# Altium footprint library UP-ROBOT Other(2012-07-12).PcbLib: 29 footprints (part 2 of 2)
Each footprint in its own frame and in the unit in brackets; x right, y up, seen from the top. Pads: shape width x height; smd on the part's side, far side on the other; paste and mask are expansions set on the pad; w line width, h text height; cw(c..) or ccw(c..) is an arc to the next point about the centre after c.
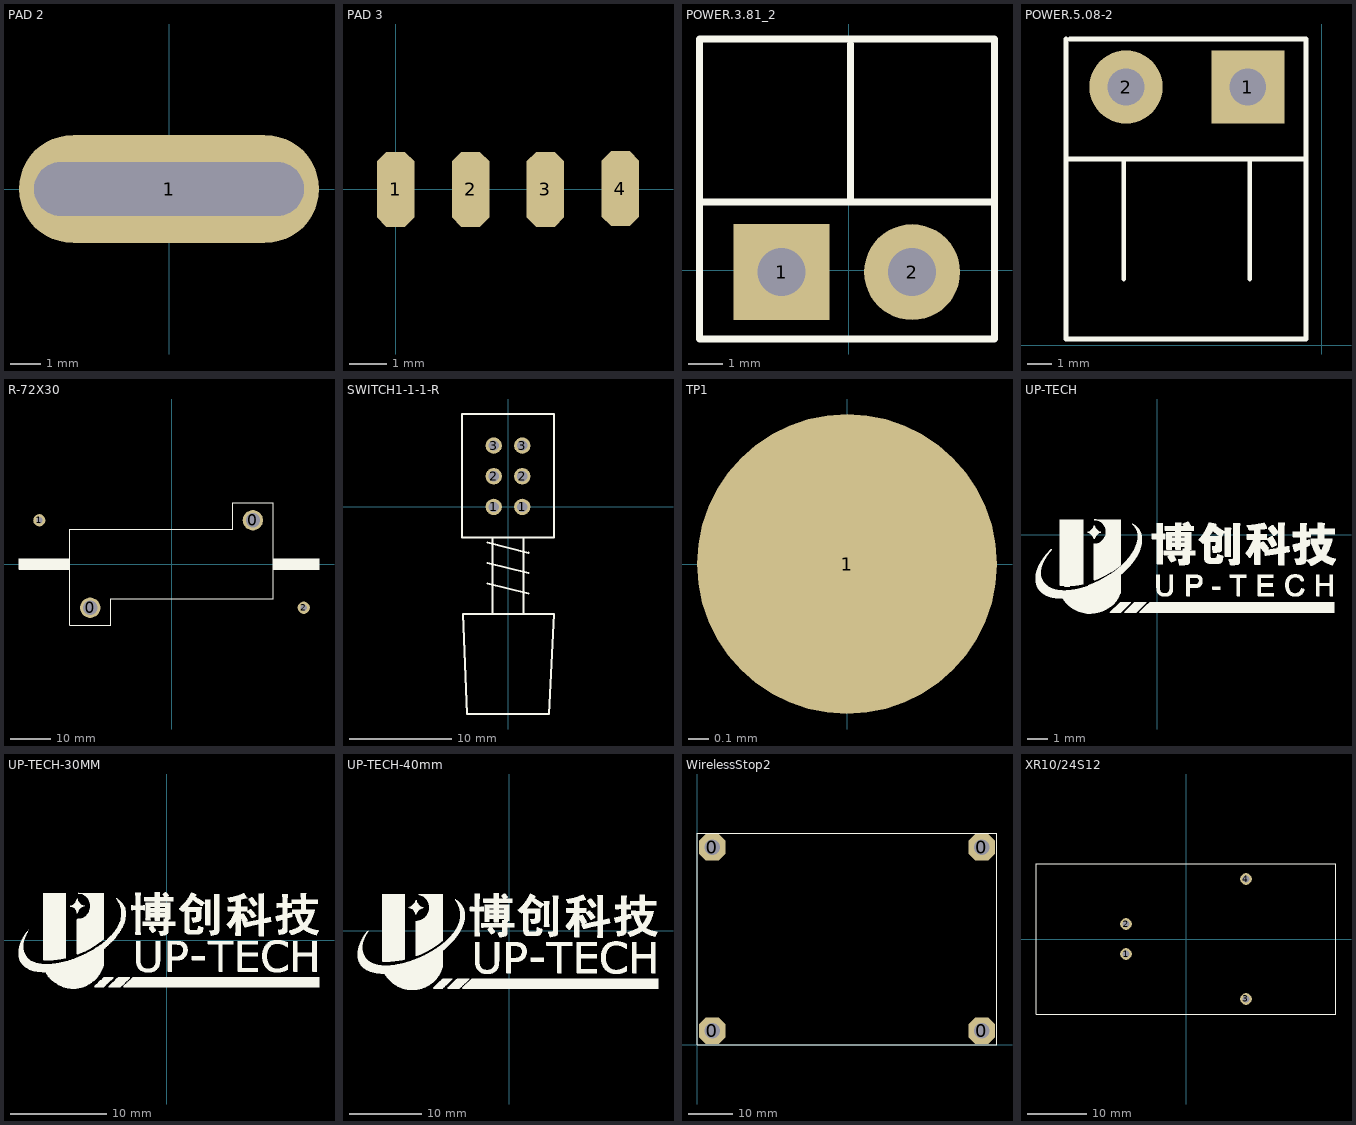
[diagram p1: the footprints below, top view; thin cyan lines are the x and y axes]

## PAD 2 [mm]
pads (1):
  oval 10x3.6 hole 1.8 slot 9 at 0 deg: 1(0,0)

## PAD 3 [mm]
pads (4):
  oct 1x2 smd: 1(0,0) 2(2,0) 3(4,0) 4(6,0.025)

## POWER.3.81_2 [mm]
pads (2):
  rect 2.8x2.8 hole 1.4: 1(-1.96,-0.05)
  round 2.8 hole 1.4: 2(1.85,-0.05)
Top Overlay:
  lines w0.203: -4.35,2 4.25,2 ; 0.049,2 0.049,6.6 ; -4.35,-2 4.25,-2 4.25,6.75 -4.35,6.75 -4.35,-2

## POWER.5.08-2 [mil]
pads (2):
  rect 120x120 hole 60: 1(-121.02,423.23)
  round 120 hole 60: 2(-321.02,423.23)
Top Overlay:
  lines w8: -419.45,501.99 -419.45,9.84 -25.75,9.84 -25.75,501.99 ; -417.32,305.12 -25.75,305.13 ; -413.39,501.97 -25.75,501.97 ; -324.8,108.26 -324.8,305.12 ; -118.11,108.26 -118.11,305.12

## R-72X30 [mm]
pads (4):
  round 5 hole 3.5: 0(-20,-10.75) 0(20,10.75)
  round 3 hole 1.5: 1(-32.5,10.75) 2(32.5,-10.75)
Top Overlay:
  rectangle: 25,-1.25 36.25,1.25
  rectangle: -37.5,-1.25 -25,1.25
  lines w0.203: -25,-1.25 -37.5,-1.25 -37.5,1.25 -25,1.25 ; 25,-1.25 36.25,-1.25 36.25,1.25 25,1.25 ; -25,-15 -15,-15 -15,-8.5 0,-8.5 25,-8.5 25,15 15,15 15,8.5 -25,8.5 -25,-15
3D body: height 16.65, standoff 0.15, extent -36,-14.75 36,14.75

## SWITCH1-1-1-R [mm]
pads (6):
  round 1.6 hole 1: 1(-1.4,0) 1(1.4,0) 2(-1.4,3) 2(1.4,3) 3(-1.4,6) 3(1.4,6)
Top Overlay:
  lines w0.203: -2,-7.5 2,-8.5 ; -2,-5.5 2,-6.5 ; -2,-3.5 2,-4.5 ; -1.5,-3 -1.5,-10.5 ; 1.5,-3 1.5,-10.5 ; -1.5,-10.5 1.5,-10.5 ; -1.5,-10.5 -4.4,-10.5 -4,-20.3 4,-20.3 4.5,-10.5 1.5,-10.5 ; -4.5,-3 4.5,-3 4.5,9.1 0,9.1 -4.5,9.1 -4.5,-3
3D body: height 10.6, standoff -3.2, extent -4.5,-20.3 4.5,9.1

## TP1 [mm]
pads (1):
  round 1.5 smd: 1(0,0)

## UP-TECH [mm]
Top Overlay:
  drawing of 3751 lines, arcs and shapes, not listed

## UP-TECH-30MM [mm]
Top Overlay:
  drawing of 8551 lines, arcs and shapes, not listed

## UP-TECH-40mm [mm]
Top Overlay:
  drawing of 11374 lines, arcs and shapes, not listed

## Vo4Ctr [mm]
3D body: height 45.39, standoff 12.28, extent 0,0 90.232,154

## WirelessStop2 [mm]
pads (4):
  oct 6x6 hole 3.5: 0(3.5,3.25) 0(3.5,44.75) 0(64.5,3.25) 0(64.5,44.75)
Top Overlay:
  lines w0.254: 0,0 0,48 68,48 68,0 0,0
3D body: height 16.4, standoff 0, extent 0,0 68,48

## XR10/24S12 [mm]
pads (4):
  round 2 hole 1.2: 1(-10.2,-2.55) 2(-10.2,2.55) 3(10.2,-10.2) 4(10.2,10.2)
Top Overlay:
  lines w0.203: -25.5,-12.8 -25.5,12.8 25.5,12.8 25.5,-12.8 -25.5,-12.8